# Altium footprint library IC.PcbLib: 93 footprints (part 5 of 6)
Each footprint in its own frame and in the unit in brackets; x right, y up, seen from the top. Pads: shape width x height; smd on the part's side, far side on the other; paste and mask are expansions set on the pad; w line width, h text height; cw(c..) or ccw(c..) is an arc to the next point about the centre after c.
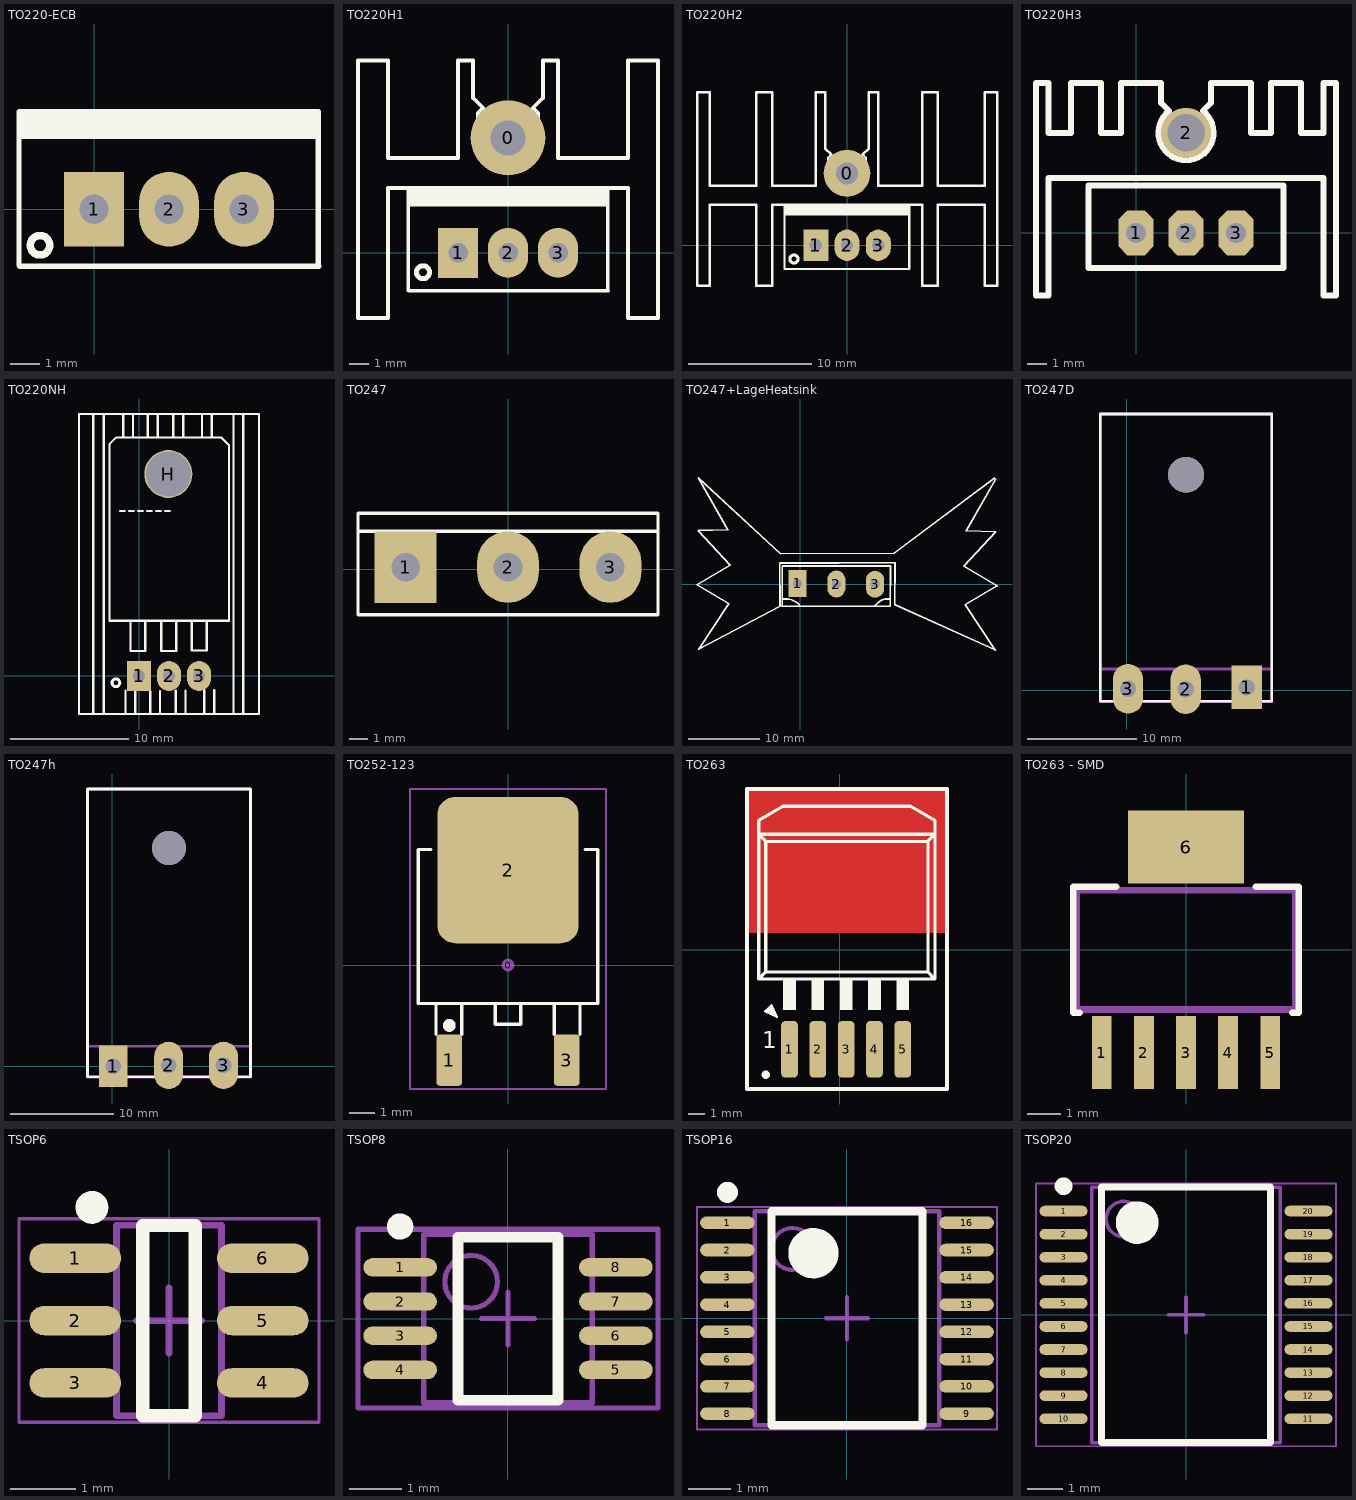
[diagram p4: the footprints below, top view; thin cyan lines are the x and y axes]

## TO220-ECB [mil] "TO-220 - 1-2-3"
height 200
pads (3):
  rect 80x100 hole 39: 1(0,0)
  oval 80x100 hole 39: 2(100,0) 3(200,0)
Top Overlay:
  circle w10: c-72.03,-48 r12.97
  rectangle: -99,94 300,130
  lines w7: 298,107 299,93 ; -100,-75 -100,130 299,130 299,-75 300,-76 -76,-76 -99,-76 -100,-75
3D body "User Library-TO-220-1.STEP": height 322.83, standoff -810.24, extent -94.88,-80 294.88,97.17

## TO220H1 [mil] "TO-220 - 1-2-3"
height 200
pads (4):
  round 150 hole 70: 0(0,230)
  rect 80x100 hole 39: 1(-100,0)
  oval 80x100 hole 39: 2(0,0) 3(100,0)
Top Overlay:
  circle w10: c-170.03,-39 r12.97
  rectangle: -201,93 198,129
  lines w7: -200,100 198.5,100 199,93 ; -200,-75 -200,130 199,130 199,-75 200,-76 -176,-76 -199,-76 -200,-75
  lines w8: -300,-130 -240,-130 -240,130 240,130 240,-130 300,-130 300,385 240,385 240,190 100,190 100,385 70,385 70,310 50,290 60,280 60,210 40,190 -40,190 -60,210 -60,280 -50,290 -70,310 -70,385 -100,385 -100,190 -240,190 -240,385 -300,385 -300,-130
3D body "User Library-TO-220-1.STEP": height 850.24, standoff -282.83, extent -194.88,-82 194.88,95.17
3D body "User Library-Disipador 34M8491-1.STEP": height 1000, standoff -122.05, extent -246,73.03 250.06,328.97

## TO220H2 [mil] "TO-220 - 1-2-3"
height 200
pads (4):
  round 150 hole 70: 0(0,230)
  rect 80x100 hole 39: 1(-100,0)
  oval 80x100 hole 39: 2(0,0) 3(100,0)
Top Overlay:
  circle w10: c-169.97,-44 r12.97
  rectangle: -201,95 198,131
  lines w7: -200,100 198.5,100 199,93 ; -200,-75 -199,-76 -176,-76 200,-76 199,-75 199,130 -200,130 -200,-75
  lines w8: -480,-130 -480,490 -440,490 -440,190 -290,190 -290,490 -240,490 -240,190 -100,190 -100,490 -70,490 -70,310 -50,290 -60,280 -60,210 -40,190 40,190 60,210 60,280 50,290 70,310 70,490 100,490 100,190 240,190 240,490 290,490 290,190 440,190 440,490 480,490 480,-130 440,-130 440,130 290,130 290,-130 240,-130 240,130 -240,130 -240,-130 -290,-130 -290,130 -440,130 -440,-130 -480,-130
3D body "User Library-TO-220-1.STEP": height 810.24, standoff -322.83, extent -194.76,-82.17 195,95
3D body "User Library-heat sink-1.STEP": height 1205.51, standoff 0, extent -448.79,-177 452.79,468.67

## TO220H3 [mil] "TO-220 1-2-3"
pads (4):
  oct 70x90 hole 40: 1(0,0) 2(100,0) 3(200,0)
  round 100 hole 75: 2(100,200)
Top Overlay:
  lines w12: 66,244 50,260 50,300 -30,300 -30,200 -70,200 -70,300 -130,300 -130,200 -175,200 -175,300 -200,300 -200,-125 -175,-125 -175,110 375,110 375,-125 400,-125 400,300 375,300 375,200 330,200 330,300 270,300 270,200 230,200 230,300 150,300 150,260 133.59,243.59 ; 66.37,243.52 ccw(c100,200) 133.77,243.41 ; -95,-70 295,-70 295,95 -95,95 -95,-70
3D body "User Library-TO-220-1.STEP": height 322.83, standoff -810.24, extent -96.88,-76.17 292.88,101
3D body "SW3dPS-heatsink TO126.STEP": height 984.25, standoff -149.61, extent -189.97,-102.25 391.97,323

## TO220NH [mil] "TO-220 - 1-2-3"
height 200
pads (4):
  rect 80x100 hole 39: 1(0,0)
  oval 80x100 hole 39: 2(100,0) 3(200,0)
  round 160 hole 150: H(98,673)
Top Overlay:
  circle w10: c-77.03,-23 r12.97
  lines w7: -99,549 -99,772 -77,794 275,794 300,769 300,730 ; -99,552 -99,184 300,184 300,553 ; -29,178 -29,83 21,83 21,180 20,181 ; 74,178 74,83 124,83 124,180 123,181 ; 176,180 176,85 226,85 226,182 225,183 ; 300,552 300,733
  lines w8: -152,-127 -152,873 ; -117,-127 -117,873 ; -53,796 -53.01,869.97 ; -45,-124 -45.01,-50.03 ; -20,796 -20.01,869.97 ; -12,-124 -12.01,-50.03 ; 29,795 28.99,868.97 ; 37,-125 36.99,-51.03 ; 62,795 61.99,868.97 ; 70,-125 69.99,-51.03 ; 114,796 113.99,869.97 ; 122,-124 121.99,-50.03 ; 147,796 146.99,869.97 ; 155,-124 154.99,-50.03 ; 210,798 209.99,871.97 ; 218,-122 217.99,-48.03 ; 243,798 242.99,871.97 ; 251,-122 250.99,-48.03 ; 315,-127 315,873 ; 348,-127 348,873 ; -200,-127 400,-127 400,873 -200,873 -200,-127
  text "------" at -69,527 h60
3D body "SW3DPS-TO-220-DEFAULT.STEP": height 165.35, standoff -118.11, extent -100,-3.66 300,763.66

## TO247 [mil] "TO247"
height 200
pads (3):
  rect 130x150 hole 60: 1(-215,5)
  oval 130x150 hole 60: 2(0,5) 3(215,5)
Top Overlay:
  lines w7: -315,80 314,80 ; -315,-95 -315,118 315,118 315,-95 -315,-95
3D body "User Library-TO-247 CASE 340L-02 Vertical.STEP": height 1399.61, standoff -230.31, extent -314.96,-81.61 314.96,115.24

## TO247+LageHeatsink [mil]
pads (3):
  rect 100x150 hole 50: 1(-15,5)
  oval 100x150 hole 50: 2(200,1) 3(415,0)
Top Overlay:
  lines w10: -102,-121 -101,-120 -101,102 501,102 500,-122 -101,-122 -100,-121 ; -100,-82 -80.43,-82 cw(c-80.43,-184.43) -8,-112 ; 208,119 526,119 524,-113 1082,-364 ; 214,118 -115,118 -113,-122 -566,-361 -398,-108 -575,-3 -391,106 -568,298 -403,303 -568,592 -111,170 520,172 1078,590 ; 415,-119 ccw(c415,-116.59) 416.71,-118.29 434,-101 cw(c479.87,-146.87) 479.87,-82 499,-82 ; 1084,-367 916,-114 1093,-9 909,100 1086,292 921,297 1086,586
3D body "User Library-TO-247 CASE 340L-02 Vertical.STEP": height 1187.01, standoff -442.91, extent -114.96,-85 514.96,111.85
3D body "User Library-OHMITE_FA-T220-64E.step": height 2600, standoff -49.61, extent -613.9,-364.71 1023.89,624.71

## TO247D [mil]
pads (3):
  rect 110x157.48 hole 59.06: 1(435,10)
  oval 110x180 hole 59.06: 2(213.66,4) 3(5,5)
via 215,780 diameter 129.92 hole 129.92
Top Overlay:
  lines w10: -95,-40 -95,1000 525,1000 525,-40 -95,-40
Mechanical 1:
  lines w10: -93.43,76.83 520.75,76.83 ; -93.43,-41.28 525,-41.28 525,1000 -93.43,1000 -93.43,-41.28
3D body "User Library-TO-247H.step": height 177.17, standoff -291.34, extent -85.12,-5 525.12,995

## TO247h [mil]
pads (3):
  rect 110x157.48 hole 59.06: 1(3,1)
  oval 110x180 hole 59.06: 2(213.66,4) 3(422.32,4)
via 215,830 diameter 129.92 hole 129.92
Top Overlay:
  lines w10: -95,-40 -95,1055 525,1055 525,-40 -95,-40
Mechanical 1:
  lines w10: -93.43,76.83 520.75,76.83 ; -93.43,-41.28 525,-41.28 525,1055 -93.43,1055 -93.43,-41.28
3D body "User Library-TO-247_bent_leads.step": height 212.6, standoff -259.84, extent -97.99,-15 527.99,1047.28

## TO252-123 [mm]
pads (4):
  round 0.5 on Mech15: 0(0,0)
  rrect25% 1x2 smd: 1(-2.285,-3.7) 3(2.285,-3.7)
  rrect25% 5.5x5.7 smd: 2(0,3.7)
Top Overlay:
  circle w0.25: c-2.285,-2.35 r0.125
  lines w0.127: -3,4.5 -3.5,4.5 -3.5,-1.5 3.5,-1.5 3.5,4.5 3,4.5 ; -2.8,-2.7 -2.8,-1.5 -1.8,-1.5 -1.8,-2.7 ; 1.8,-2.7 1.8,-1.5 2.8,-1.5 2.8,-2.7 ; -0.5,-2.3 0.5,-2.3 0.5,-1.5 -0.5,-1.5 -0.5,-2.3
Mechanical 15:
  lines w0.076: -3.81,-4.826 3.81,-4.826 3.81,6.858 -3.81,6.858 -3.81,-4.826
3D body "DPAK.stp": height 2.31, standoff 0, extent -3.3,-3.951 3.3,5.762

## TO263 [mm]
pads (5):
  rrect50% 1x3.4 smd: 1(-3.019,-5.969) 2(-1.319,-5.969) 4(2.081,-5.969) 5(3.781,-5.969)
  rrect50% 1x3.4 smd mask+0: 3(0.381,-5.969)
Top Layer:
  rectangle: -5.568,1.016 6.432,9.65
Top Overlay:
  circle w0.25: c-4.443,-7.493 r0.125
  rectangle: -3.398,-3.607 -2.64,-1.728
  rectangle: -1.698,-3.607 -0.94,-1.728
  rectangle: 0.002,-3.607 0.76,-1.728
  rectangle: 1.702,-3.607 2.46,-1.728
  rectangle: 3.402,-3.607 4.16,-1.728
  lines w0.127: -4.293,-3.511 -4.104,-3.319 -3.774,-4.03 ; -4.293,-3.511 -4.485,-3.7 -3.774,-4.03 ; -4.293,-3.511 -3.774,-4.03
  lines w0.178: -4.307,-3.649 -4.129,-3.827 ; -4.155,-3.497 -3.977,-3.675
  lines w0.2: -4.873,-1.753 5.71,-1.753 ; -4.873,-1.753 -4.873,6.926 ; -4.873,-1.753 -4.45,-1.329 ; -4.873,6.926 5.71,6.926 ; -4.873,6.926 -4.873,7.747 -3.392,8.619 4.228,8.619 5.71,7.747 5.71,6.926 ; -4.873,6.926 -4.45,6.502 ; -4.45,-1.329 -4.45,6.502 ; -4.45,-1.329 5.287,-1.329 ; -4.45,6.502 5.287,6.502 ; 5.287,-1.329 5.287,6.502 ; 5.287,-1.329 5.71,-1.753 ; 5.287,6.502 5.71,6.926 ; 5.71,-1.753 5.71,6.926
  lines w0.254: -5.568,-8.35 -5.568,9.65 6.432,9.65 6.432,-8.35 -5.568,-8.35
  text "1" at -4.645,-5.918 h1
Top Solder:
  rectangle: -5.136,1.397 5.99,8.56
  lines w0.254: -3.482,8.935 -4.963,8.512 ; 4.319,8.935 5.8,8.512 ; 5.969,8.382 6.096,8.255 6.096,1.27 5.461,1.27 -5.197,1.27 -5.202,1.275 -5.202,6.926 -5.202,8.196 ; 6.039,6.926 6.039,8.196 ; -5.202,8.196 cw(c-4.873,8.196) -4.964,8.512 ; -5.202,8.196 cw(c-4.873,8.196) -4.964,8.512 ; -3.392,8.948 ccw(c-3.392,8.619) -3.482,8.935 cw(c-3.392,8.619) -3.392,8.948 ; -3.392,8.948 4.228,8.948 ; 4.228,8.948 cw(c4.228,8.619) 4.319,8.935 ccw(c4.228,8.619) 4.228,8.948 ; 5.801,8.512 cw(c5.71,8.196) 6.039,8.196 ; 5.801,8.512 cw(c5.71,8.196) 6.039,8.196
  lines w0.508: -4.196,8.577 5.05,8.577
3D body "SW3dPS-TO-263 5Ld.STEP": height 4.57, standoff -0.01, extent -4.729,-6.839 5.431,7.801

## TO263 - SMD [mm]
pads (6):
  rect 0.6x2.2 smd: 1(-2.54,-3.1) 2(-1.27,-3.1) 3(0,-3.1) 4(1.27,-3.1) 5(2.54,-3.1)
  rect 3.5x2.2 smd: 6(0,3.1)
Top Overlay:
  lines w0.2: -3.2,-1.9 -3.4,-1.9 -3.4,1.9 -2.1,1.9 ; 2.1,1.9 3.4,1.9 3.4,-1.9 3.2,-1.9
Mechanical 16:
  lines w0.2: -3.3,-1.8 -3.3,1.8 3.3,1.8 3.3,-1.8 -3.3,-1.8
Mechanical 29:
  text ".Designator" at -1.2,-0.7 h1.5
3D body "TPS73701DCQ.step": height 1.8, standoff 0, extent -3.275,-3.63 3.275,3.63

## TSOP6 [mm] "TSOP, 6-Leads, Body 2.90x1.63mm, Pitch 0.95mm, IPC High Density"
height 1
pads (6):
  oval 1.4x0.45 smd: 1(-1.429,0.95) 2(-1.429,0) 3(-1.429,-0.95) 4(1.429,-0.95) 5(1.429,0) 6(1.429,0.95)
Top Overlay:
  circle w0.25: c-1.175,1.725 r0.125
  lines w0.2: -0.4,-1.45 -0.4,1.45 0.4,1.45 0.4,-1.45 -0.4,-1.45
Mechanical 13:
  lines w0.1: -0.8,-1.45 -0.8,1.45 0.8,1.45 0.8,-1.45 -0.8,-1.45
Mechanical 15:
  lines w0.05: -2.286,-1.55 -2.286,1.55 2.286,1.55 2.286,-1.55 -2.286,-1.55
  lines w0.1: -0.5,0 0.5,0 ; 0,-0.5 0,0.5
3D body "User Library-TSOP6.step": height 1.04, standoff -0.01, extent -1.375,-1.5 1.375,1.5

## TSOP8 [mm] "TSOP, 8-Leads, Body 3x3mm, Pitch 0.65mm, IPC High Density"
height 1.1
pads (8):
  oval 1.4x0.35 smd: 1(-2.05,0.975) 2(-2.05,0.325) 3(-2.05,-0.325) 4(-2.05,-0.975) 5(2.05,-0.975) 6(2.05,-0.325) 7(2.05,0.325) 8(2.05,0.975)
Top Overlay:
  circle w0.25: c-2.05,1.75 r0.125
  lines w0.2: -0.95,-1.55 -0.95,1.55 0.95,1.55 0.95,-1.55 -0.95,-1.55
Mechanical 13:
  circle w0.1: c-0.7,0.7 r0.5
  lines w0.1: -1.6,-1.6 -1.6,1.6 1.6,1.6 1.6,-1.6 -1.6,-1.6
Mechanical 15:
  lines w0.1: -0.5,0 0.5,0 ; 0,-0.5 0,0.5 ; -2.85,-1.7 -2.85,1.7 2.85,1.7 2.85,-1.7 -2.85,-1.7
3D body "TSOP65P470X150-8N.step": height 1.5, standoff 0, extent -2.35,-1.5 2.35,1.5

## TSOP16 [mm] "TSOP, 16-Leads, Body 5.10x4.40mm, Pitch 0.65mm, IPC High Density"
height 1
pads (16):
  oval 1.3x0.3 smd: 1(-2.85,2.275) 2(-2.85,1.625) 3(-2.85,0.975) 4(-2.85,0.325) 5(-2.85,-0.325) 6(-2.85,-0.975) 7(-2.85,-1.625) 8(-2.85,-2.275) 9(2.85,-2.275) 10(2.85,-1.625) 11(2.85,-0.975) 12(2.85,-0.325) 13(2.85,0.325) 14(2.85,0.975) 15(2.85,1.625) 16(2.85,2.275)
Top Overlay:
  circle w0.6: c-0.8,1.55 r0.3
  circle w0.25: c-2.85,3 r0.125
  lines w0.2: -1.8,-2.55 1.8,-2.55 1.8,2.55 -1.8,2.55 -1.8,-2.55
Mechanical 13:
  circle w0.1: c-1.3,1.65 r0.5
  lines w0.1: -2.2,-2.55 2.2,-2.55 2.2,2.55 -2.2,2.55 -2.2,-2.55
Mechanical 15:
  lines w0.05: -3.575,-2.65 3.575,-2.65 3.575,2.65 -3.575,2.65 -3.575,-2.65
  lines w0.1: -0.5,0 0.5,0 ; 0,-0.5 0,0.5
3D body "TSOP65P640X150-16N.step": height 1.5, standoff 0, extent -3.19,-2.6 3.19,2.6

## TSOP20 [mm] "TSOP, 20-Leads, Body 7.20x5.30mm, Pitch 0.65mm, IPC High Density"
height 1
pads (20):
  oval 1.35x0.3 smd: 1(-3.45,2.925) 2(-3.45,2.275) 3(-3.45,1.625) 4(-3.45,0.975) 5(-3.45,0.325) 6(-3.45,-0.325) 7(-3.45,-0.975) 8(-3.45,-1.625) 9(-3.45,-2.275) 10(-3.45,-2.925) 11(3.45,-2.925) 12(3.45,-2.275) 13(3.45,-1.625) 14(3.45,-0.975) 15(3.45,-0.325) 16(3.45,0.325) 17(3.45,0.975) 18(3.45,1.625) 19(3.45,2.275) 20(3.45,2.925)
Top Overlay:
  circle w0.25: c-3.45,3.625 r0.125
  circle w0.6: c-1.375,2.6 r0.3
  lines w0.2: -2.375,-3.6 -2.375,3.6 2.375,3.6 2.375,-3.6 -2.375,-3.6
Mechanical 13:
  circle w0.1: c-1.75,2.7 r0.5
  lines w0.1: -2.65,-3.6 -2.65,3.6 2.65,3.6 2.65,-3.6 -2.65,-3.6
Mechanical 15:
  lines w0.05: -4.225,-3.7 -4.225,3.7 4.225,3.7 4.225,-3.7 -4.225,-3.7
  lines w0.1: -0.5,0 0.5,0 ; 0,-0.5 0,0.5
3D body "TSOP65P770X150-20N.step": height 1.5, standoff 0, extent -3.85,-3.6 3.85,3.6